# Altium footprint library Arduino Nano Every PCBLib.PcbLib: 81 footprints (part 5 of 6)
Each footprint in its own frame and in the unit in brackets; x right, y up, seen from the top. Pads: shape width x height; smd on the part's side, far side on the other; paste and mask are expansions set on the pad; w line width, h text height; cw(c..) or ccw(c..) is an arc to the next point about the centre after c.
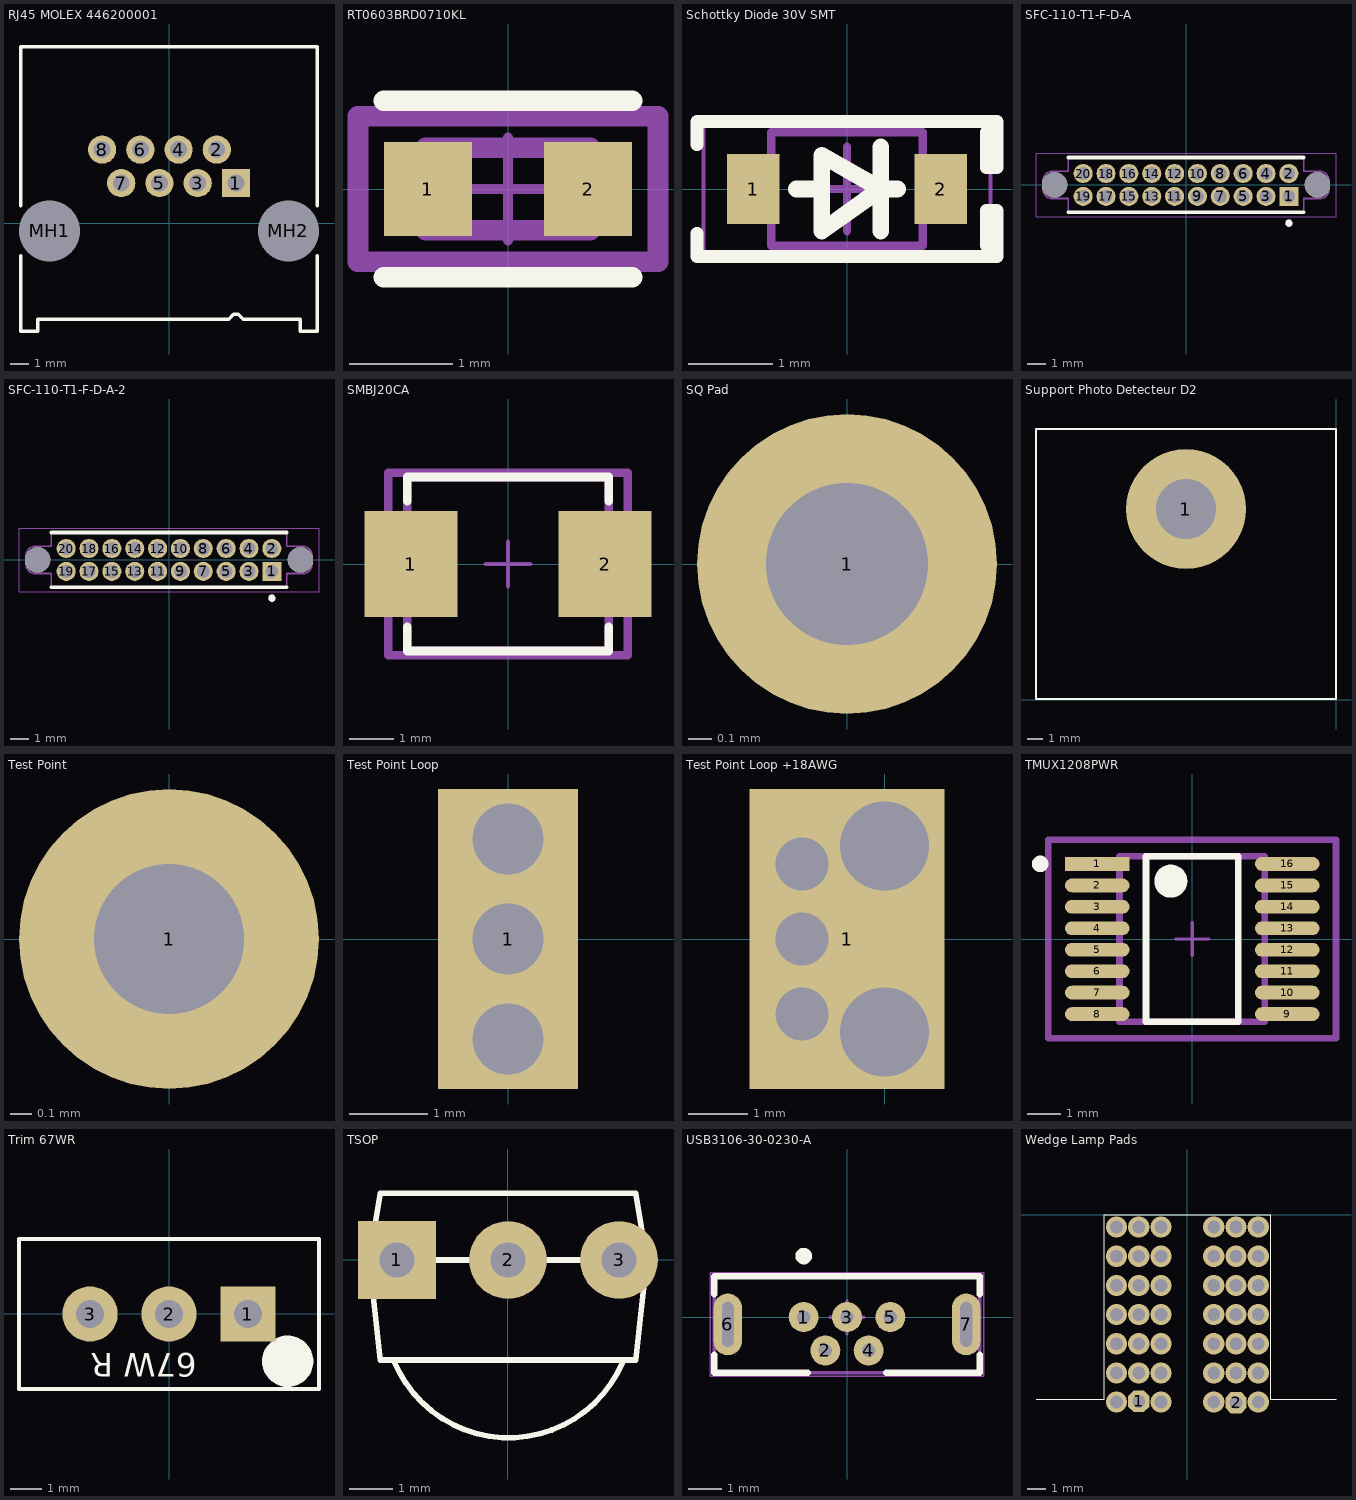
[diagram p4: the footprints below, top view; thin cyan lines are the x and y axes]

## RJ45 MOLEX 446200001 [mm] "RJ45 RA TH"
pads (10):
  rect 1.5x1.5 hole 0.9: 1(3.556,2.144)
  round 1.5 hole 0.9: 2(2.54,3.922) 3(1.524,2.144) 4(0.508,3.922) 5(-0.508,2.144) 6(-1.524,3.922) 7(-2.54,2.144) 8(-3.556,3.922)
  round 2.95 hole 3.25 unplated: MH1(-6.35,-0.396) MH2(6.35,-0.396)
Top Overlay:
  lines w0.178: -7.875,-1.728 -7.875,-5.726 -6.985,-5.726 -6.985,-5.091 3.175,-5.091 3.429,-4.837 3.683,-4.837 3.937,-5.091 6.985,-5.091 6.985,-5.726 7.875,-5.726 7.875,-1.728 ; -7.875,0.936 -7.875,9.384 7.875,9.384 7.875,0.936
3D body: height 10.16, standoff 2.9, extent -6.985,-5.726 6.985,-5.091
3D body: height 12.19, standoff 2.9, extent -3.175,-5.726 3.175,-5.091
3D body: height 2.9, standoff 1.52, extent 3.302,-5.853 3.81,-5.726
3D body: height 11.18, standoff 2.9, extent -3.81,-5.726 3.81,-5.091
3D body: height 13.21, standoff 0.25, extent -7.874,-5.599 7.874,9.387

## RT0603BRD0710KL [mm] "10 kOhms ±0.1% 0.1W, 1/10W Chip Resistor 0603 (1608 Metric) Thin Film"
pads (2):
  rect 0.859x0.912 smd paste+0 mask+0: 1(-0.777,0) 2(0.777,0)
Top Overlay:
  lines w0.2: -1.206,-0.856 1.206,-0.856 ; -1.206,0.856 1.206,0.856
Top Assembly:
  lines w0.2: -1.456,-0.706 1.456,-0.706 1.456,0.706 -1.456,0.706 -1.456,-0.706
Top Courtyard:
  lines w0.2: -1.456,-0.706 1.456,-0.706 1.456,0.706 -1.456,0.706 -1.456,-0.706
Board:
  lines w0.2: -0.8,-0.4 0.8,-0.4 0.8,0.4 -0.8,0.4 -0.8,-0.4
Top Component Center:
  lines w0.1: -0.5,0 0.5,0 ; 0,-0.5 0,0.5
3D body "Res_Yageo_RT0603CRE0724K3L_eec.STEP": height 0.25, standoff 0, extent -1.456,-0.706 1.456,0.706

## Schottky Diode 30V SMT [mm] "NSR0530HT1G"
pads (2):
  rect 0.625x0.83 smd: 1(-1.112,0) 2(1.112,0)
Top Overlay:
  lines w0.15: -1.778,-0.525 -1.778,-0.8 1.778,-0.8 ; -1.778,0.525 -1.778,0.8 1.778,0.8 ; 1.778,-0.8 1.651,-0.673 1.651,-0.254 1.778,-0.254 1.778,-0.8 ; 1.778,0.8 1.651,0.673 1.651,0.254 1.778,0.254 1.778,0.8
  lines w0.2: -0.6,0 -0.3,0 ; 0.4,-0.5 0.4,0.5 ; 0.6,0 0.4,0 ; 0.4,0 -0.3,0.4 -0.3,-0.5 0.4,0
Mechanical 13:
  lines w0.1: -0.9,-0.675 -0.9,0.675 0.9,0.675 0.9,-0.675 -0.9,-0.675
Mechanical 15:
  lines w0.05: -1.7,-0.85 -1.7,0.85 1.7,0.85 1.7,-0.85 -1.7,-0.85
  lines w0.1: -0.5,0 0.5,0 ; 0,-0.5 0,0.5
3D body "SOD-323.step": height 1.05, standoff 0, extent -1.36,-0.625 1.36,0.625

## SFC-110-T1-F-D-A [mm] "Headers & Wire Housings .050 Tiger Eye Cost-Effective Reliable Socket Strip"
pads (22):
  rect 1.06x1.06 hole 0.71: 1(5.715,-0.635)
  round 1.06 hole 0.71: 2(5.715,0.635) 3(4.445,-0.635) 4(4.445,0.635) 5(3.175,-0.635) 6(3.175,0.635) 7(1.905,-0.635) 8(1.905,0.635) 9(0.635,-0.635) 10(0.635,0.635) 11(-0.635,-0.635) 12(-0.635,0.635) 13(-1.905,-0.635) 14(-1.905,0.635) 15(-3.175,-0.635) 16(-3.175,0.635) 17(-4.445,-0.635) 18(-4.445,0.635) 19(-5.715,-0.635) 20(-5.715,0.635)
  round 1.42 hole 1.42 unplated: ""(-7.305,0) ""(7.305,0)
Top Overlay:
  circle w0.2: c5.715,-2.125 r0.1
  lines w0.2: -6.54,-1.525 6.54,-1.525 ; -6.54,1.525 6.54,1.525
Mechanical 13:
  circle w0.2: c5.715,-2.125 r0.1
  lines w0.1: -7.94,-0.25 ccw(c-7.43,-0.25) -7.43,-0.76 -6.54,-0.76 -6.54,-1.525 6.54,-1.525 6.54,-0.76 7.43,-0.76 ccw(c7.43,-0.25) 7.94,-0.25 7.94,0.25 ccw(c7.43,0.25) 7.43,0.76 6.54,0.76 6.54,1.525 -6.54,1.525 -6.54,0.76 -7.43,0.76 ccw(c-7.43,0.25) -7.94,0.25 -7.94,-0.25
Mechanical 15:
  lines w0.05: -8.335,-1.775 -8.335,1.775 8.335,1.775 8.335,-1.775 -8.335,-1.775

## SFC-110-T1-F-D-A-2 [mm] "Headers & Wire Housings .050 Tiger Eye Cost-Effective Reliable Socket Strip"
pads (22):
  rect 1.06x1.06 hole 0.71: 1(5.715,-0.635)
  round 1.06 hole 0.71: 2(5.715,0.635) 3(4.445,-0.635) 4(4.445,0.635) 5(3.175,-0.635) 6(3.175,0.635) 7(1.905,-0.635) 8(1.905,0.635) 9(0.635,-0.635) 10(0.635,0.635) 11(-0.635,-0.635) 12(-0.635,0.635) 13(-1.905,-0.635) 14(-1.905,0.635) 15(-3.175,-0.635) 16(-3.175,0.635) 17(-4.445,-0.635) 18(-4.445,0.635) 19(-5.715,-0.635) 20(-5.715,0.635)
  round 1.42 hole 1.42 unplated: ""(-7.305,0) ""(7.305,0)
Top Overlay:
  circle w0.2: c5.715,-2.125 r0.1
  lines w0.2: -6.54,-1.525 6.54,-1.525 ; -6.54,1.525 6.54,1.525
Mechanical 13:
  circle w0.2: c5.715,-2.125 r0.1
  lines w0.1: -7.94,-0.25 ccw(c-7.43,-0.25) -7.43,-0.76 -6.54,-0.76 -6.54,-1.525 6.54,-1.525 6.54,-0.76 7.43,-0.76 ccw(c7.43,-0.25) 7.94,-0.25 7.94,0.25 ccw(c7.43,0.25) 7.43,0.76 6.54,0.76 6.54,1.525 -6.54,1.525 -6.54,0.76 -7.43,0.76 ccw(c-7.43,0.25) -7.94,0.25 -7.94,-0.25
Mechanical 15:
  lines w0.05: -8.335,-1.775 -8.335,1.775 8.335,1.775 8.335,-1.775 -8.335,-1.775
3D body "SFC-110-T1-F-D-A.stp": height 4.57, standoff -3.05, extent -7.938,-1.524 7.938,2.159

## SMBJ20CA [mm] "32.4V Clamp 18.6A Ipp Tvs Diode Surface Mount SMB (DO-214AA)"
pads (2):
  rect 2.1x2.4 smd paste+0 mask+0: 1(-2.2,0) 2(2.2,0)
Top Overlay:
  lines w0.2: -2.285,-1.425 -2.285,-1.97 2.285,-1.97 2.285,-1.425 ; -2.285,1.425 -2.285,1.97 2.285,1.97 2.285,1.425
Mechanical 5:
  lines w0.2: -2.715,-2.07 2.715,-2.07 2.715,2.07 -2.715,2.07 -2.715,-2.07
Mechanical 13:
  lines w0.2: -2.285,-1.97 2.285,-1.97 2.285,1.97 -2.285,1.97 -2.285,-1.97
Mechanical 15:
  lines w0.2: -2.715,-2.07 2.715,-2.07 2.715,2.07 -2.715,2.07 -2.715,-2.07
Top Component Center:
  lines w0.1: -0.5,0 0.5,0 ; 0,-0.5 0,0.5
3D body "Diode_Bourns_Inc_SMBJ20CA_eec.STEP": height 0.25, standoff 0, extent -2.715,-2.07 2.715,2.07

## SQ Pad [mm] "Pad"
pads (1):
  round 1.3 hole 0.7: 1(0,0)

## Support Photo Detecteur D2 [mm] "Support Photo Detecteur D2"
pads (1):
  round 7.62 hole 3.81: 1(-9.55,12.116)
Top Overlay:
  lines w0.127: -19.075,0.051 -0.025,0.051 -0.025,17.196 -19.075,17.196 -19.075,0.051
3D body: height 6.35, standoff 0, extent -19.075,0.051 -0.025,17.196
3D body: height 44.45, standoff 6.35, extent -19.075,0.051 -12.725,6.401
3D body: height 44.45, standoff 6.35, extent -6.375,0.051 -0.025,6.401
3D body: height 50.8, standoff 44.45, extent -19.075,0.051 -0.025,6.401
3D body: height 12.7, standoff 6.35, extent -19.075,0.051 -0.025,6.401
3D body: height 6.38, standoff -0.03, extent -10.689,10.974 -8.407,13.259

## Test Point [mm] "Test Point"
pads (1):
  round 1.4 hole 0.7: 1(0,0)

## Test Point Loop [mil] "Test Point Loop"
pads (3):
  rect 0x0 hole 35.4: 1(0,-49.83) 1(0,50.17)
  rect 70x150 hole 35.4: 1(0,0.17)
3D body: height 91, standoff 3, extent -17.49,-61.82 17.51,62.18
3D body: height 15, standoff -70, extent -16.99,-61.82 17,-27.82
3D body: height 15, standoff -70, extent -16.99,28.18 17.01,62.18

## Test Point Loop +18AWG [mil] "Test Point Loop"
pads (6):
  rect 0x0 hole 35.4: 1(-55.26,-50) 1(-55.26,50)
  round 0 hole 35.4: 1(-55.26,0)
  rect 130x200 all layers, no hole: 1(-25.26,0)
  round 0 hole 59.1: 1(-0.26,-62) 1(-0.26,62)
3D body: height 15, standoff -70, extent -72.24,28.01 -38.25,62
3D body: height 15, standoff -70, extent -72.25,-61.99 -38.25,-28
3D body: height 91, standoff 3, extent -72.75,-61.99 -37.75,62.01

## TMUX1208PWR [mm] "5-V, 8: 1, 1-channel general-purpose analog multiplexer with 1.8-V input logic 16-TSSOP -40 to 125"
pads (16):
  rect 1.955x0.421 smd paste+0 mask+0: 1(-2.875,2.275)
  rrect100% 1.955x0.421 smd paste+0 mask+0: 2(-2.875,1.625) 3(-2.875,0.975) 4(-2.875,0.325) 5(-2.875,-0.325) 6(-2.875,-0.975) 7(-2.875,-1.625) 8(-2.875,-2.275) 9(2.875,-2.275) 10(2.875,-1.625) 11(2.875,-0.975) 12(2.875,-0.325) 13(2.875,0.325) 14(2.875,0.975) 15(2.875,1.625) 16(2.875,2.275)
Top Overlay:
  circle w0.5: c-0.648,1.75 r0.25
  circle w0.25: c-4.603,2.275 r0.125
  lines w0.2: -1.398,-2.5 1.398,-2.5 1.398,2.5 -1.398,2.5 -1.398,-2.5
Top Assembly:
  lines w0.2: -4.353,-3 4.353,-3 4.353,3 -4.353,3 -4.353,-3
Top Courtyard:
  lines w0.2: -4.353,-3 4.353,-3 4.353,3 -4.353,3 -4.353,-3
Board:
  lines w0.2: -2.2,-2.5 2.2,-2.5 2.2,2.5 -2.2,2.5 -2.2,-2.5
Top Component Center:
  lines w0.1: -0.5,0 0.5,0 ; 0,-0.5 0,0.5
3D body "IC_TEXAS_INSTRUMENTS_SN74HC165PWR_eec.STEP": height 0.25, standoff 0, extent -4.353,-3 4.353,3

## Trim 67WR [mil] "Trim 10T Vertical"
pads (3):
  rect 70x70 hole 35.4: 1(100,-0.29)
  round 70 hole 35.4: 2(0,-0.29) 3(-100,-0.29)
Top Overlay:
  circle w35: c150.32,-60.2 r15
  lines w5: -190,-95.29 -190,94.71 190,94.71 190,-95.29 -190,-95.29
  text "67W R" at 35,-50.29 h30
3D body: height 478, standoff 450, extent 110.32,-60.21 190.32,-50.21
3D body: height 476, standoff 6, extent 111.32,-94.13 189.01,-16.28
3D body: height 417, standoff 5, extent -190,-95.29 190,94.71

## TSOP [mil] "IR Sensor"
pads (3):
  rect 70x70 hole 31.5: 1(-99.75,-0.41)
  round 70 hole 31.5: 2(0.26,-0.41) 3(100.25,-0.41)
Top Overlay:
  lines w5: -102.19,-91.42 ccw(c0.81,-49.03) 103.65,-91.83 ; -124.74,-0.41 -114.74,59.59 115.26,59.59 125.26,-0.41 ; -124.74,-0.41 -114.74,-90.41 115.26,-90.41 125.26,-0.41 ; -124.74,-0.41 -62.24,-0.41 62.76,-0.41 125.26,-0.41
3D body: height 330, standoff 50, extent -124.74,-90.41 125.26,59.59
3D body: height 290, standoff 110, extent -89.36,-159.47 89.87,19.59
3D body: height 80, standoff -20, extent -114.72,-15.29 -84.78,14.59
3D body: height 80, standoff -20, extent -14.72,-15.29 15.22,14.59
3D body: height 80, standoff -20, extent 85.28,-15.29 115.22,14.59

## USB3106-30-0230-A [mm] "USB - Micro AB 2.0 Receptacle Connector 5 Position, Vertical, Through Hole with 2.30 mm (Standard) Shell Stakes, 5-Pin THD, RoHS, Tape and Reel"
pads (7):
  round 0.9 hole 0.4: 1(-1.3,0) 2(-0.65,-1) 3(0,0) 4(0.65,-1) 5(1.3,0)
  oval 0.85x1.85 hole 0.35 slot 1.35 at 90 deg: 6(-3.575,-0.22) 7(3.575,-0.22)
Top Overlay:
  circle w0.25: c-1.3,1.83 r0.125
  lines w0.2: -3.98,-1.128 -3.98,-1.67 -1.173,-1.67 ; -3.98,0.688 -3.98,1.23 3.98,1.23 3.98,0.688 ; 1.173,-1.67 3.98,-1.67 3.98,-1.128
Mechanical 13:
  lines w0.1: -3.98,-1.67 3.98,-1.67 3.98,1.23 -3.98,1.23 -3.98,-1.67
Mechanical 15:
  lines w0.05: -4.1,-1.77 4.1,-1.77 4.1,1.33 -4.1,1.33 -4.1,-1.77
  lines w0.1: -0.5,0 0.5,0 ; 0,-0.5 0,0.5
3D body "USB3106-30-0230-A_revB.step": height 5.61, standoff -2.3, extent -3.98,-1.684 3.98,1.251

## Wedge Lamp Pads [mil] "Wedge Lamp Socket"
pads (2):
  oct 46x46 hole 27.6: 1(-104.85,-403.18) 2(105.15,-406.18)
via 153.15,-26.68 diameter 46 hole 27.6
via 105.15,-26.68 diameter 46 hole 27.6
via 57.15,-26.68 diameter 46 hole 27.6
via -152.85,-26.68 diameter 46 hole 27.6
via -104.85,-26.68 diameter 46 hole 27.6
via -56.85,-26.68 diameter 46 hole 27.6
via -56.85,-89.68 diameter 46 hole 27.6
via -104.85,-89.68 diameter 46 hole 27.6
via -152.85,-89.68 diameter 46 hole 27.6
via 57.15,-89.68 diameter 46 hole 27.6
via 105.15,-89.68 diameter 46 hole 27.6
via 153.15,-89.68 diameter 46 hole 27.6
via -56.85,-152.68 diameter 46 hole 27.6
via -104.85,-152.68 diameter 46 hole 27.6
via -152.85,-152.68 diameter 46 hole 27.6
via 57.15,-152.68 diameter 46 hole 27.6
via 105.15,-152.68 diameter 46 hole 27.6
via 153.15,-152.68 diameter 46 hole 27.6
via -56.85,-215.68 diameter 46 hole 27.6
via -104.85,-215.68 diameter 46 hole 27.6
via -152.85,-215.68 diameter 46 hole 27.6
via 57.15,-215.68 diameter 46 hole 27.6
via 105.15,-215.68 diameter 46 hole 27.6
via 153.15,-215.68 diameter 46 hole 27.6
via -56.85,-278.68 diameter 46 hole 27.6
via -104.85,-278.68 diameter 46 hole 27.6
via -152.85,-278.68 diameter 46 hole 27.6
via 57.15,-278.68 diameter 46 hole 27.6
via 105.15,-278.68 diameter 46 hole 27.6
via 153.15,-278.68 diameter 46 hole 27.6
via -56.85,-341.68 diameter 46 hole 27.6
via -104.85,-341.68 diameter 46 hole 27.6
via -152.85,-341.68 diameter 46 hole 27.6
via 57.15,-341.68 diameter 46 hole 27.6
via 105.15,-341.68 diameter 46 hole 27.6
via 153.15,-341.68 diameter 46 hole 27.6
via -56.85,-404.68 diameter 46 hole 27.6
via -152.85,-404.68 diameter 46 hole 27.6
via 57.15,-404.68 diameter 46 hole 27.6
via 153.15,-404.68 diameter 46 hole 27.6
Top Overlay:
  lines w1: -326.85,-398.68 -179.85,-398.68 -179.85,0.32 180.15,0.32 180.15,-398.68 321.15,-398.68
Multi-Layer:
  region: -29.85,-398.18 -29.85,-0.18 -179.85,-0.18 -179.85,-398.18
  region: 180.15,-398.18 180.15,-0.18 30.15,-0.18 30.15,-398.18